# Altium footprint library 元件库PCB.PcbLib: 63 footprints (part 3 of 4)
Each footprint in its own frame and in the unit in brackets; x right, y up, seen from the top. Pads: shape width x height; smd on the part's side, far side on the other; paste and mask are expansions set on the pad; w line width, h text height; cw(c..) or ccw(c..) is an arc to the next point about the centre after c.
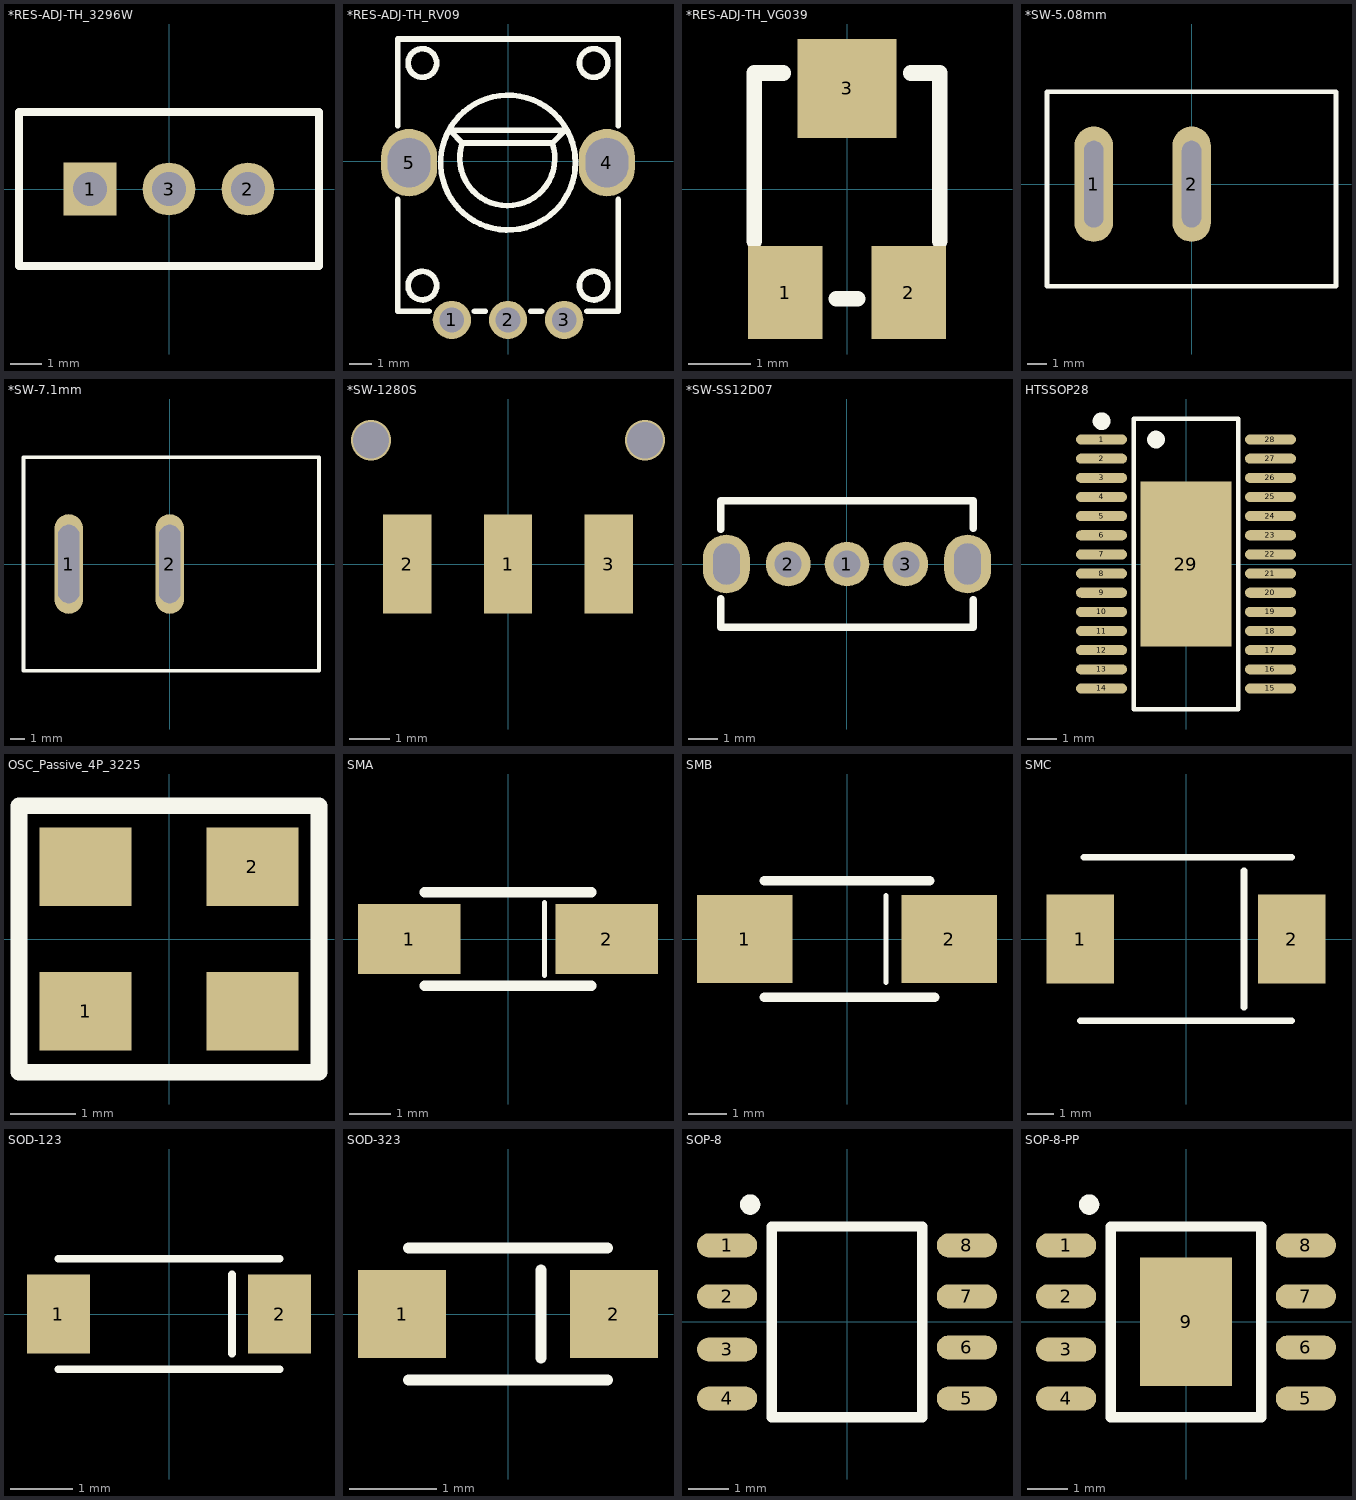
[diagram p2: the footprints below, top view; thin cyan lines are the x and y axes]

## *RES-ADJ-TH_3296W [mm] "锟斤拷*专锟矫凤拷装锟斤拷3296锟斤拷位锟斤拷专锟矫凤拷装"
pads (3):
  rect 1.7x1.7 hole 1.1: 1(-2.54,0)
  round 1.7 hole 1.1: 2(2.54,0) 3(0,0)
Top Overlay:
  lines w0.254: -4.826,-2.476 4.826,-2.476 4.826,2.476 -4.826,2.476 -4.826,-2.476
3D body "User Library-3296W-1.step": height 11.52, standoff -2, extent -4.765,-2.415 4.765,2.415

## *RES-ADJ-TH_RV09 [mm] "锟斤拷*专锟矫凤拷装锟斤拷锟斤拷锟斤拷锟斤拷位锟斤拷专锟矫非憋拷准锟斤拷装"
pads (5):
  round 1.7 hole 1.1: 1(-2.5,-7.056) 2(0,-7.056) 3(2.5,-7.056)
  oval 2.5x3 hole 1.9 slot 2.2 at 90 deg: 4(4.4,-0.056) 5(-4.4,-0.056)
Top Overlay:
  circle w0.254: c3.81,-5.532 r0.635
  circle w0.254: c-3.81,-5.532 r0.635
  circle w0.254: c0,-0.056 r3
  circle w0.254: c-3.81,4.374 r0.635
  circle w0.254: c3.81,4.374 r0.635
  lines w0.254: -4.9,-1.7 -4.9,-6.675 -3.512,-6.675 ; -4.9,1.588 -4.9,5.444 4.9,5.444 4.9,1.588 ; -1.488,-6.675 -1.012,-6.675 ; 1.012,-6.675 1.488,-6.675 ; 1.976,0.818 cw(c-0.028,0.141) -2.032,0.818 ; 3.512,-6.675 4.9,-6.675 4.9,-1.7 ; -2.032,0.818 1.977,0.818 2.54,1.381 -2.54,1.381 -2.54,1.326 -2.032,0.818
3D body "�ޱ���2.step": height 25.05, standoff -2.95, extent -6,-7.5 6,5.7

## *RES-ADJ-TH_VG039 [mm] "锟斤拷*专锟矫凤拷装锟斤拷锟斤拷锟杰碉拷位锟斤拷专锟矫非憋拷准锟斤拷装"
pads (3):
  rect 1.2x1.5 smd: 1(-1,-1.675) 2(1,-1.675)
  rect 1.6x1.6 smd: 3(0,1.625)
Top Overlay:
  lines w0.254: -1.5,-0.844 -1.5,0.075 -1.5,1.875 ; -0.169,-1.775 0.169,-1.775 ; 1.5,-0.844 1.5,1.875 ; 1.5,0.075 1.5,1.875 ; -1.5,1.875 -1.031,1.875 ; -1.5,1.875 -1.031,1.875 ; -1.5,1.875 -1.031,1.875 ; 1.031,1.875 1.5,1.875 ; 1.031,1.875 1.5,1.875 ; 1.031,1.875 1.5,1.875
Mechanical 15:
  circle w0.2: c-1.2,-2.125 r0.1
3D body "���ܵ�λ��.step": height 0.5, standoff 0, extent -1.524,-1.95 1.476,1.95

## *SW-5.08mm [mm] "锟斤拷*专锟矫凤拷装锟斤拷锟斤拷锟斤拷锟斤拷5mm锟斤拷锟酵匡拷锟斤拷"
pads (2):
  oval 2x6 hole 1 slot 4.5 at 90 deg: 1(-5.08,0) 2(0,0)
Top Overlay:
  lines w0.254: -7.5,-5.304 7.5,-5.304 7.5,4.796 -7.5,4.796 -7.5,-5.304
3D body "5mm.step": height 7.5, standoff -13, extent -7.5,-5.254 7.5,4.746

## *SW-7.1mm [mm] "锟斤拷*专锟矫凤拷装锟斤拷锟斤拷锟斤拷锟斤拷7mm锟斤拷锟酵匡拷锟斤拷"
pads (2):
  oval 2x7 hole 1.5 slot 5.5 at 90 deg: 1(-7.1,0) 2(0,0)
Top Overlay:
  lines w0.254: -10.287,-7.5 -10.287,7.5 10.5,7.5 10.5,-7.5 -10.287,-7.5
3D body "7mm.step": height 15.61, standoff -8.5, extent -10.373,-7.634 10.627,7.366

## *SW-1280S [mm]
pads (3):
  rect 1.2x2.45 smd: 1(0,0) 2(-2.5,0) 3(2.5,0)
via 3.4,3.075 diameter 1 hole 0.9
via -3.4,3.075 diameter 1 hole 0.9
3D body "User Library-K3-1280S-K1.step": height 3.66, standoff -0.59, extent -4.55,-0.402 4.55,6.698

## *SW-SS12D07 [mil]
pads (5):
  round 60 hole 36: 1(0,0) 2(-78.74,0) 3(78.74,0)
  oval 62.99x78.74 hole 35.43 slot 55.12 at 90 deg: ""(-161.42,0) ""(161.42,0)
Top Overlay:
  lines w10: -169.29,-46.71 -169.29,-84.65 169.29,-84.64 169.29,-47.7 ; -169.29,46.71 -169.29,84.65 169.29,84.65 169.29,47.7
Mechanical 15:
  lines w0.1: -0.01,21.42 0.01,21.44
3D body "User Library-MiniSwitch-2.step": height 342.52, standoff -110.24, extent -169.29,-88.58 169.29,88.58

## HTSSOP28 [mm]
pads (29):
  oval 1.731x0.343 smd: 1(-2.866,4.225) 2(-2.866,3.575) 3(-2.866,2.925) 4(-2.866,2.275) 5(-2.866,1.625) 6(-2.866,0.975) 7(-2.866,0.325) 8(-2.866,-0.325) 9(-2.866,-0.975) 10(-2.866,-1.625) 11(-2.866,-2.275) 12(-2.866,-2.925) 13(-2.866,-3.575) 14(-2.866,-4.225) 15(2.866,-4.225) 16(2.866,-3.575) 17(2.866,-2.925) 18(2.866,-2.275) 19(2.866,-1.625) 20(2.866,-0.975) 21(2.866,-0.325) 22(2.866,0.325) 23(2.866,0.975) 24(2.866,1.625) 25(2.866,2.275) 26(2.866,2.925) 27(2.866,3.575) 28(2.866,4.225)
  rect 3.1x5.6 smd: 29(0,0)
Top Overlay:
  circle w0.3: c-2.866,4.849 r0.15
  circle w0.3: c-1.019,4.225 r0.15
  lines w0.152: -1.771,-4.926 -1.771,4.926 1.771,4.926 1.771,-4.926 -1.771,-4.926
3D body "User Library-PWP (R-PDSO-G28).STEP": height 1.2, standoff 0, extent -3.31,-4.9 3.31,4.9

## OSC_Passive_4P_3225 [mm]
pads (4):
  rect 1.4x1.2 smd: 1(-1.27,-1.1) 2(1.27,1.1) ""(-1.27,1.1) ""(1.27,-1.1)
Top Overlay:
  lines w0.254: -2.286,-2.032 2.286,-2.032 2.286,2.032 -2.286,2.032 -2.286,-2.032
3D body "晶振_无源_4P.step": height 0.65, standoff 0, extent -1.849,-1.4 1.651,1.4

## SMA [mm] "锟斤拷锟斤拷锟斤拷肖锟截伙拷锟斤拷锟斤拷锟杰的凤拷装锟斤拷锟斤拷锟斤拷锟竭碉拷一锟斤拷为锟斤拷锟斤拷"
pads (2):
  rect 2.5x1.7 smd: 1(-2.413,0) 2(2.413,0)
Top Overlay:
  lines w0.127: 0.889,-0.889 0.889,0.889
  lines w0.254: -2.032,-1.143 2.032,-1.143 ; -2.032,1.143 2.032,1.143
3D body "User Library-DO-214AC SMA.step": height 2.37, standoff -0.03, extent -2.6,-1.3 2.6,1.3

## SMB [mm] "锟斤拷锟斤拷锟斤拷肖锟截伙拷锟斤拷锟斤拷锟杰的凤拷装锟斤拷锟斤拷锟斤拷锟竭碉拷一锟斤拷为锟斤拷锟斤拷"
pads (2):
  rect 2.5x2.3 smd: 1(-2.667,0) 2(2.667,0)
Top Overlay:
  lines w0.127: 1.016,-1.143 1.016,1.143
  lines w0.254: -2.159,-1.524 2.286,-1.524 ; -2.159,1.524 2.159,1.524
3D body "User Library-DO-214AA SMB.step": height 2.27, standoff -0.03, extent -2.7,-1.8 2.7,1.8

## SMC [mm] "锟斤拷锟斤拷锟斤拷肖锟截伙拷锟斤拷锟斤拷锟杰的凤拷装锟斤拷锟斤拷锟斤拷锟竭碉拷一锟斤拷为锟斤拷锟斤拷"
pads (2):
  rect 2.5x3.3 smd: 1(-3.937,0) 2(3.937,0)
Top Overlay:
  lines w0.254: -3.937,-3.048 3.937,-3.048 ; -3.81,3.048 3.937,3.048 ; 2.159,-2.54 2.159,2.54
3D body "User Library-DO-214AB SMC.step": height 2.27, standoff -0.03, extent -3.975,-2.95 3.975,2.95

## SOD-123 [mil] "锟斤拷锟斤拷锟斤拷锟斤拷片锟斤拷锟斤拷锟杰碉拷SOD123锟斤拷装锟斤拷锟斤拷锟斤拷锟竭碉拷一锟斤拷为锟斤拷锟斤拷"
pads (2):
  rect 40x50 smd: 1(-70,0) 2(70,0)
Top Overlay:
  lines w5: -70,-35 70,-35 ; -70,35 70,35 ; 40,-25 40,25
3D body "CircuitWorks-SOD123.step": height 50, standoff 0, extent -72.84,-31.5 72.84,31.5

## SOD-323 [mil] "锟斤拷锟斤拷锟斤拷锟斤拷片锟斤拷锟斤拷锟杰碉拷SOD323锟斤拷装锟斤拷锟斤拷锟斤拷锟竭碉拷一锟斤拷为锟斤拷锟斤拷"
pads (2):
  rect 40x40 smd: 1(-48,0) 2(48,0)
Top Overlay:
  lines w5: -45,-30 45,-30 ; -45,30 45,30 ; 15,-20 15,20
3D body "User Library-SOD323-1.step": height 43.31, standoff 0, extent -51.18,-26.58 51.18,26.58

## SOP-8 [mm] "通锟斤拷SOP8不带底部焊盘"
pads (8):
  oval 1.5x0.6 smd: 1(-2.984,1.905) 2(-2.984,0.635) 3(-2.984,-0.686) 4(-2.984,-1.905) 5(2.984,-1.905) 6(2.984,-0.635) 7(2.984,0.635) 8(2.984,1.905)
Top Overlay:
  circle w0.254: c-2.413,2.921 r0.127
  lines w0.254: -1.873,-2.373 1.873,-2.373 1.873,2.373 -1.873,2.373 -1.873,-2.373
3D body "SOIC8E_MPS.step": height 1.7, standoff -0.05, extent -3.099,-2.502 3.099,2.502

## SOP-8-PP [mm] "通锟斤拷SOP8锟斤拷装锟斤拷锟斤拷锟阶诧拷锟斤拷锟斤拷"
pads (9):
  oval 1.5x0.6 smd: 1(-2.984,1.905) 2(-2.984,0.635) 3(-2.984,-0.686) 4(-2.984,-1.905) 5(2.984,-1.905) 6(2.984,-0.635) 7(2.984,0.635) 8(2.984,1.905)
  rect 2.3x3.2 smd: 9(0,0)
Top Overlay:
  circle w0.254: c-2.413,2.921 r0.127
  lines w0.254: -1.873,-2.373 1.873,-2.373 1.873,2.373 -1.873,2.373 -1.873,-2.373
3D body "SOIC8E_MPS.step": height 1.7, standoff -0.05, extent -3.099,-2.502 3.099,2.502